# Altium footprint library IntLib.PcbLib: 221 footprints (part 12 of 14)
Each footprint in its own frame and in the unit in brackets; x right, y up, seen from the top. Pads: shape width x height; smd on the part's side, far side on the other; paste and mask are expansions set on the pad; w line width, h text height; cw(c..) or ccw(c..) is an arc to the next point about the centre after c.
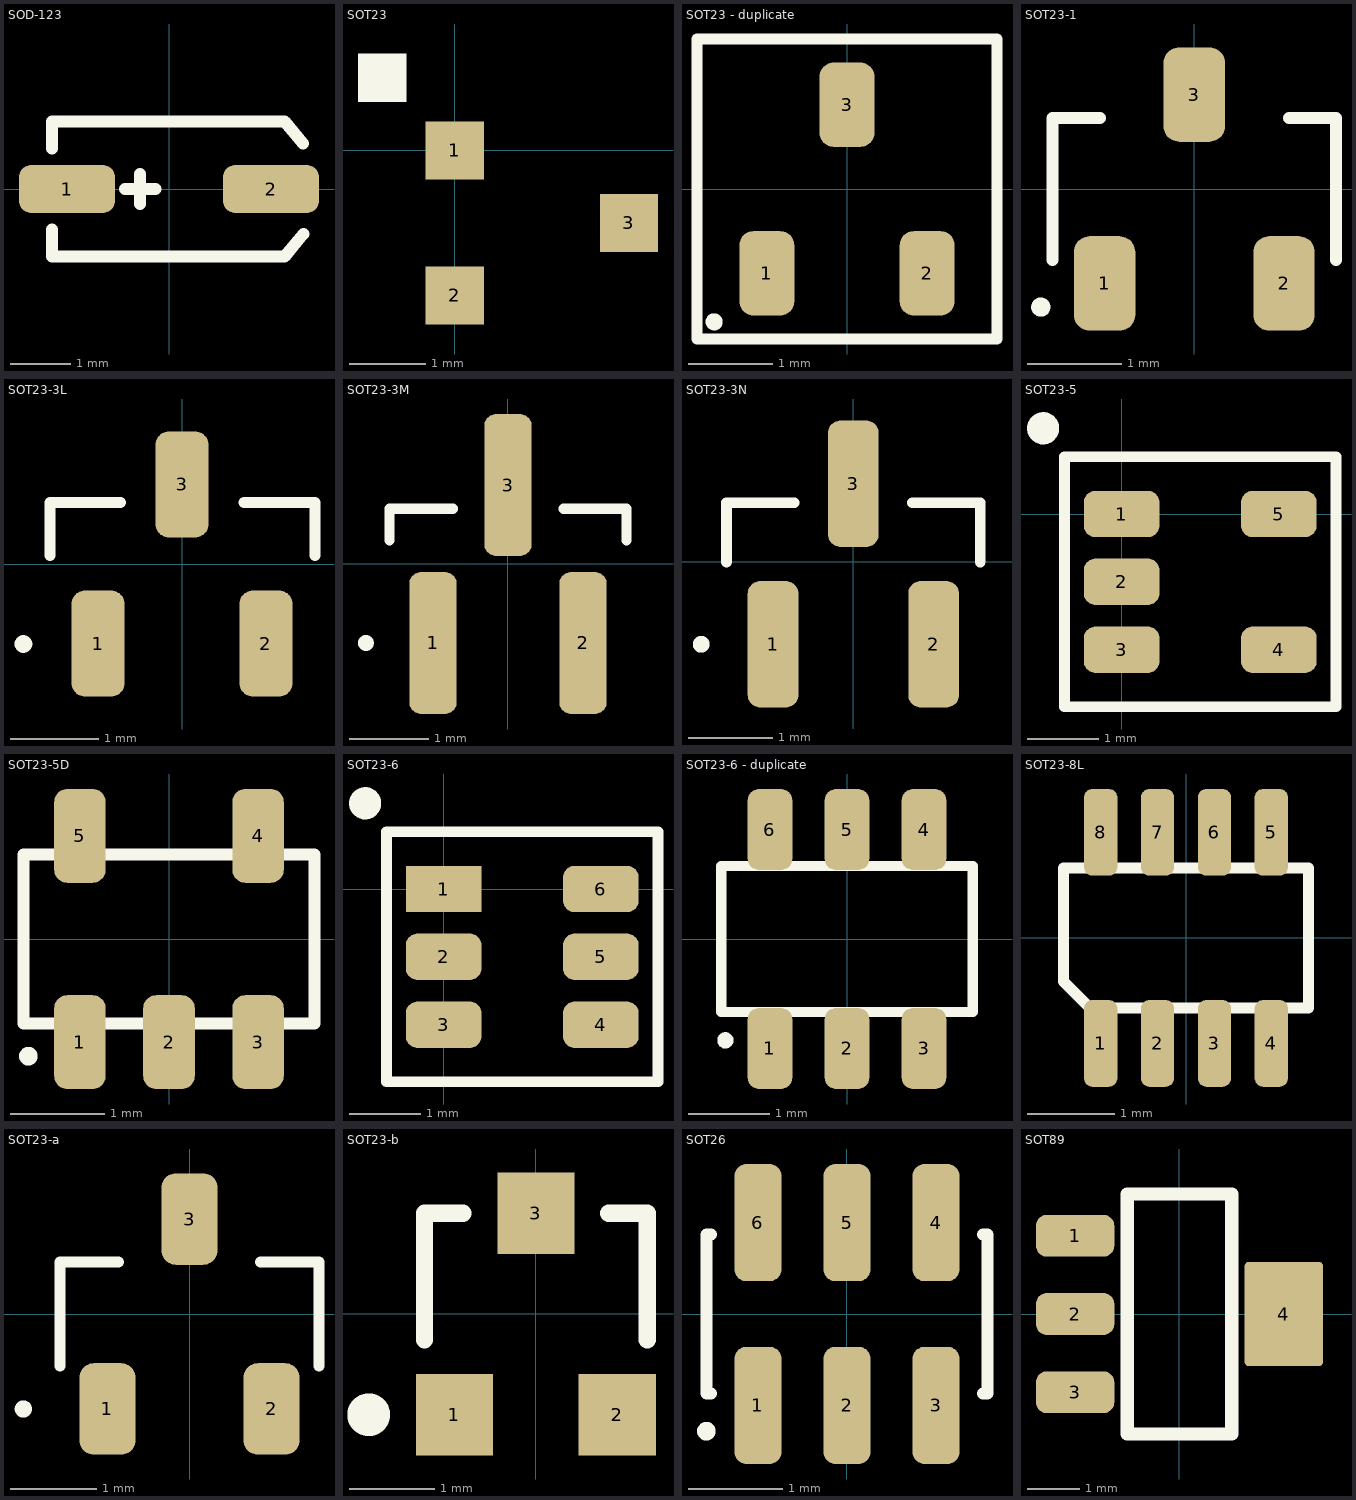
[diagram p11: the footprints below, top view; thin cyan lines are the x and y axes]

## SOD-123 [mm] "SOD-123; 2 Leads; Body 2.7 x 1.6 mm, (LxW)"
height 1.35
pads (2):
  rrect50% 1.6x0.8 smd: 1(-1.7,0) 2(1.7,0)
Top Overlay:
  lines w0.2: -1.95,-0.675 -1.95,-1.125 1.928,-1.125 2.241,-0.747 ; -1.95,0.675 -1.95,1.125 1.928,1.125 2.233,0.756 ; -0.737,0 -0.229,0 ; -0.483,-0.254 -0.483,0.254
3D body: height 1.43, standoff -0.02, extent -1.869,-0.862 1.981,0.838

## SOT23 [mil]
height 118.11
pads (3):
  rect 30x30 smd: 1(0,0) 2(0,-75) 3(90,-37.5)
Top Overlay:
  region: -50,25 -25,25 -25,50 -50,50
3D body: height 41.34, standoff -1.97, extent -4,-97 94.42,21.11

## SOT23 - duplicate [mm] "SOT-23; 3 Leads; Body 3.0 x 2.6 mm Pitch 0.95mm"
pads (3):
  rrect50% 0.65x1 smd: 1(-0.95,-1) 2(0.95,-1) 3(0,1)
Top Overlay:
  circle w0.102: c-1.575,-1.575 r0.051
  lines w0.127: -1.778,-1.778 -1.778,1.778 1.778,1.778 1.778,-1.778 -1.778,-1.778
3D body: height 1, standoff -0.02, extent -1.46,-1.231 1.46,1.245

## SOT23-1 [mm] "SOT23, 3-Leads, Body 2.9x1.3mm, Pitch 0.95mm, Lead Span 2.5mm"
height 1.1
pads (3):
  rrect50% 0.65x1 smd: 1(-0.95,-1) 2(0.95,-1) 3(0,1)
Top Overlay:
  circle w0.102: c-1.625,-1.25 r0.051
  lines w0.127: -1.5,-0.75 -1.5,0.75 -1,0.75 ; 1,0.75 1.5,0.75 1.5,-0.75
3D body: height 1, standoff -0.02, extent -1.458,-1.254 1.462,1.222

## SOT23-3L [mm] "SOT23, 3-Leads, Body 2.9x1.3mm, Pitch 0.95mm, Lead Span 2.5mm"
height 1.1
pads (3):
  rrect50% 0.6x1.2 smd: 1(-0.95,-0.9) 2(0.95,-0.9) 3(0,0.9)
Top Overlay:
  circle w0.1: c-1.795,-0.905 r0.05
  lines w0.127: -1.495,0.095 -1.495,0.695 -0.695,0.695 ; 0.705,0.695 1.505,0.695 1.505,0.095
3D body: height 1, standoff -0.02, extent -1.455,-1.25 1.465,1.226

## SOT23-3M [mm] "SOT23, 3-Leads, Body 2.9x1.3mm, Pitch 0.95mm, Lead Span 2.5mm"
height 1.1
pads (3):
  rrect50% 0.6x1.8 smd: 1(-0.945,-1.005) 2(0.955,-1.005) 3(0.005,0.995)
Top Overlay:
  circle w0.1: c-1.795,-1.005 r0.05
  lines w0.127: -1.495,0.295 -1.495,0.695 -0.695,0.695 ; 0.705,0.695 1.505,0.695 1.505,0.295
3D body: height 1, standoff -0.02, extent -1.455,-1.25 1.465,1.226

## SOT23-3N [mm] "SOT23, 3-Leads, Body 2.9x1.3mm, Pitch 0.95mm, Lead Span 2.5mm"
height 1.1
pads (3):
  rrect50% 0.6x1.5 smd: 1(-0.95,-0.974) 2(0.95,-0.974) 3(0,0.926)
Top Overlay:
  circle w0.1: c-1.8,-0.974 r0.05
  lines w0.127: -1.5,0 -1.5,0.7 -0.7,0.7 ; 0.7,0.7 1.5,0.7 1.5,0
3D body: height 1, standoff -0.02, extent -1.448,-1.262 1.472,1.214

## SOT23-5 [mm]
height 3
pads (5):
  rrect50% 1.06x0.65 smd: 1(0,0) 2(0,-0.95) 3(0,-1.9) 4(2.2,-1.9) 5(2.2,0)
Top Overlay:
  circle w0.25: c-1.1,1.2 r0.1
  lines w0.15: -0.8,-2.7 3,-2.7 3,0.8 -0.8,0.8 -0.8,-2.7
3D body: height 1, standoff 0, extent -0.07,-2.41 2.27,0.51

## SOT23-5D [mm] "SOT23, 5-Leads, Body 2.9x1.3mm, Pitch 0.95mm, Lead Span 2.5mm"
height 1.45
pads (5):
  rrect50% 0.55x1 smd: 1(-0.95,-1.1) 2(0,-1.1) 3(0.95,-1.1) 4(0.95,1.1) 5(-0.95,1.1)
Top Overlay:
  circle w0.1: c-1.5,-1.25 r0.05
  lines w0.127: -1.55,-0.9 1.55,-0.9 1.55,0.9 -1.55,0.9 -1.55,-0.9
3D body: height 1.09, standoff -0.01, extent -1.45,-1.422 1.45,1.378

## SOT23-6 [mm]
height 3
pads (6):
  rect 1.06x0.65 smd: 1(0,0)
  rrect50% 1.06x0.65 smd: 2(0,-0.95) 3(0,-1.9) 4(2.2,-1.9) 5(2.2,-0.95) 6(2.2,0)
Top Overlay:
  circle w0.25: c-1.1,1.2 r0.1
  lines w0.15: -0.8,-2.7 -0.8,0.8 3,0.8 3,-2.7 -0.8,-2.7
3D body: height 1, standoff 0, extent -0.25,-2.45 2.45,0.55

## SOT23-6 - duplicate [mm] "SOT23, 6-Leads, Body 2.9x1.3mm, Pitch 0.95mm, Lead Span 2.5mm"
height 1.45
pads (6):
  rrect50% 0.55x1 smd: 1(-0.95,-1.35) 2(0,-1.35) 3(0.95,-1.35) 4(0.95,1.35) 5(0,1.35) 6(-0.95,1.35)
Top Overlay:
  circle w0.1: c-1.5,-1.25 r0.05
  lines w0.127: -1.55,-0.9 -1.55,0.9 1.55,0.9 1.55,-0.9 -1.55,-0.9
3D body: height 1.09, standoff 0, extent -1.397,-1.219 1.397,1.206

## SOT23-8L [mil] "SOT23, 8-Leads, Body 2.9x1.3mm, Pitch 0.95mm, Lead Span 2.5mm"
pads (8):
  rrect50% 15x39 smd mask-1000: 1(-38.39,-47.5) 2(-12.8,-47.5) 3(12.8,-47.5) 4(38.39,-47.5) 5(38.39,47.5) 6(12.8,47.5) 7(-12.8,47.5) 8(-38.39,47.5)
Top Overlay:
  lines w5: -55.12,-19.69 -55.12,31.5 55.12,31.5 55.12,-31.5 -43.31,-31.5 -55.12,-19.69
Top Solder:
  region: -29,-68 -29,-26 -51,-26 -51,-68
  lines w20: -39,34 -39,60 ; -13,-60 -13,-34 ; -13,34 -13,60 ; 13,-60 13,-34 ; 13,34 13,60 ; 39,-60 39,-34 ; 39,34 39,60

## SOT23-a [mm] "SOT-23; 3 Leads; Body 3.0 x 2.6 mm, inc. leads (LxW max)"
height 1.1
pads (3):
  rrect50% 0.65x1.06 smd: 1(-0.95,-1.1) 2(0.95,-1.1) 3(0,1.1)
Top Overlay:
  circle w0.1: c-1.925,-1.1 r0.05
  lines w0.127: -1.5,-0.6 -1.5,0.6 -0.825,0.6 ; 0.825,0.6 1.5,0.6 1.5,-0.6
3D body: height 1, standoff -0.02, extent -1.45,-1.238 1.47,1.238

## SOT23-b [mm] "SOT-23; 3 Leads; Body 3.1 x 2.5 mm, inc. leads (LxW max)"
height 1.1
pads (3):
  rect 0.9x0.95 smd: 1(-0.95,-1.175) 2(0.95,-1.175) 3(0,1.175)
Top Overlay:
  circle w0.25: c-1.95,-1.175 r0.125
  lines w0.2: -1.3,-0.3 -1.3,1.175 -0.85,1.175 ; 0.85,1.175 1.3,1.175 1.3,-0.3
3D body: height 1, standoff -0.02, extent -1.46,-1.25 1.46,1.226

## SOT26 [mm] "SOT-457/SC-74; 6 Leads; Body 3.1 x 2.6 mm, inc. leads (LxW max)"
height 1.1
pads (6):
  rrect50% 0.5x1.25 smd: 1(-0.95,-0.975) 2(0,-0.975) 3(0.95,-0.975) 4(0.95,0.975) 5(0,0.975) 6(-0.95,0.975)
Top Overlay:
  circle w0.1: c-1.5,-1.25 r0.05
  lines w0.127: -1.45,-0.85 -1.5,-0.85 -1.5,0.85 -1.45,0.85 ; 1.45,-0.85 1.5,-0.85 1.5,0.85 1.45,0.85
3D body: height 0.94, standoff -0.09, extent -1.5,-1.385 1.5,1.386

## SOT89 [mm]
pads (4):
  rrect50% 1.5x0.8 smd: 1(-2,1.5) 2(-2,0) 3(-2,-1.5)
  rrect10% 1.5x2 smd: 4(2,0)
Top Overlay:
  lines w0.254: -1,-2.3 -1,2.3 1,2.3 1,-2.3 -1,-2.3
3D body: height 1.59, standoff -0.02, extent -2.208,-2.285 2.042,2.315